# Altium footprint library IC.PCBLIB: 359 footprints (part 1 of 23)
Each footprint in its own frame and in the unit in brackets; x right, y up, seen from the top. Pads: shape width x height; smd on the part's side, far side on the other; paste and mask are expansions set on the pad; w line width, h text height; cw(c..) or ccw(c..) is an arc to the next point about the centre after c.
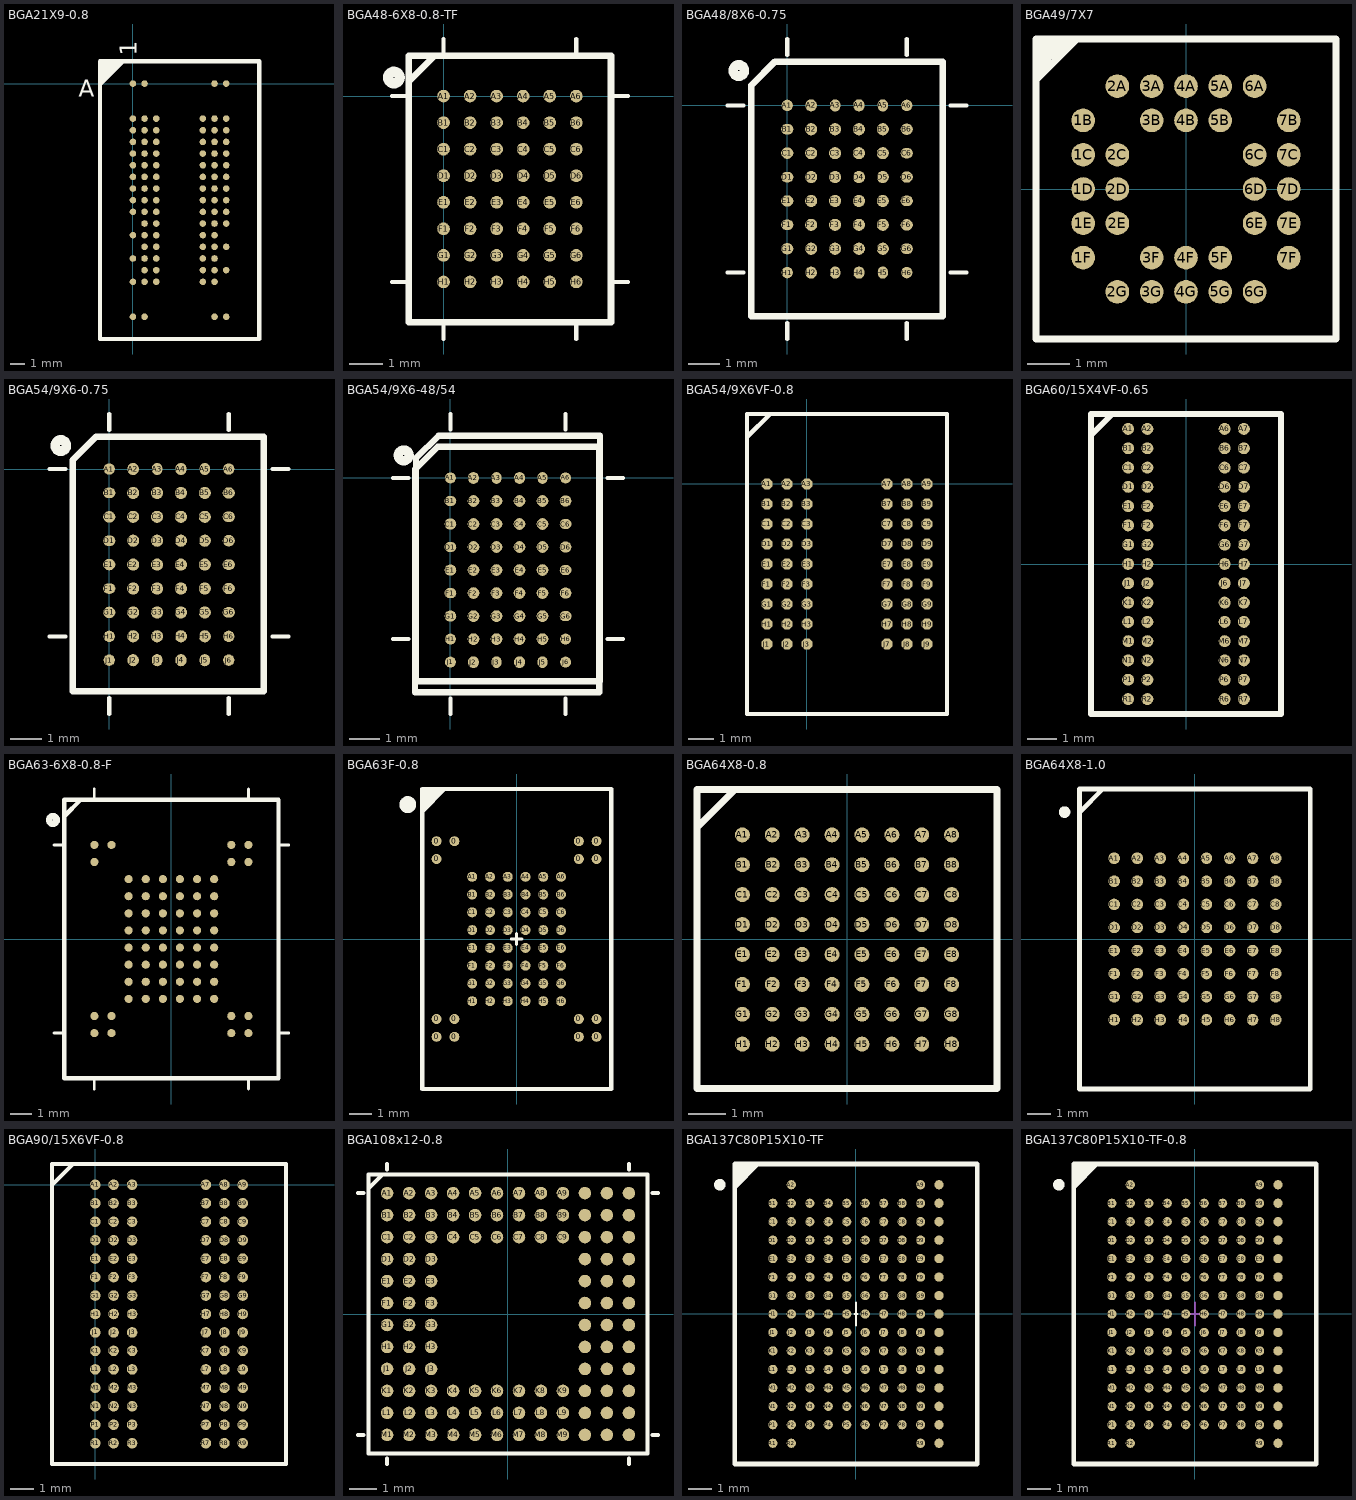
[diagram p0: the footprints below, top view; thin cyan lines are the x and y axes]

## BGA21X9-0.8 [mm]
height 1.27
pads (92):
  round 0.45 smd mask-25.4: A1(0,0) A2(0.8,0) A8(5.6,0) A9(6.4,0) AA1(0,-16.004) AA2(0.8,-16.004) AA8(5.6,-16.004) AA9(6.4,-16.004) D1(0,-2.401) D2(0.8,-2.401) D3(1.6,-2.401) D7(4.8,-2.401) D8(5.6,-2.401) D9(6.4,-2.401) E1(0,-3.201) E2(0.8,-3.201) E3(1.6,-3.201) E7(4.8,-3.201) E8(5.6,-3.201) E9(6.4,-3.201) F1(0,-4.001) F2(0.8,-4.001) F3(1.6,-4.001) F7(4.8,-4.001) F8(5.6,-4.001) F9(6.4,-4.001) G1(0,-4.801) G2(0.8,-4.801) G3(1.6,-4.801) G7(4.8,-4.801) G8(5.6,-4.801) G9(6.4,-4.801) H1(0,-5.601) H2(0.8,-5.601) H3(1.6,-5.601) H7(4.8,-5.601) H8(5.6,-5.601) H9(6.4,-5.601) J1(0,-6.402) J2(0.8,-6.402) J3(1.6,-6.402) J7(4.8,-6.402) J8(5.6,-6.402) J9(6.4,-6.402) K1(0,-7.202) K2(0.8,-7.202) K3(1.6,-7.202) K7(4.8,-7.202) K8(5.6,-7.202) K9(6.4,-7.202) L1(0,-8.002) L2(0.8,-8.002) L3(1.6,-8.002) L7(4.8,-8.002) L8(5.6,-8.002) L9(6.4,-8.002) M1(0,-8.802) M2(0.8,-8.802) M3(1.6,-8.802) M7(4.8,-8.802) M8(5.6,-8.802) M9(6.4,-8.802) N2(0.8,-9.603) N3(1.6,-9.603) N7(4.8,-9.603) N8(5.6,-9.603) N9(6.4,-9.603) P1(0,-10.403) P2(0.8,-10.403) P3(1.6,-10.403) P7(4.8,-10.403) P8(5.6,-10.403) R2(0.8,-11.203) R3(1.6,-11.203) R7(4.8,-11.203) R8(5.6,-11.203) R9(6.4,-11.203) T1(0,-12.003) T2(0.8,-12.003) T3(1.6,-12.003) T7(4.8,-12.003) T8(5.6,-12.003) U2(0.8,-12.804) U3(1.6,-12.804) U7(4.8,-12.804) U8(5.6,-12.804) U9(6.4,-12.804) V1(0,-13.604) V2(0.8,-13.604) V3(1.6,-13.604) V7(4.8,-13.604) V8(5.6,-13.604)
TopOverlay:
  region: -2.261,-0.256 -0.483,1.522 -2.261,1.522
  lines w0.305: -2.261,-17.528 -2.261,1.522 8.661,1.522 8.661,-17.528 -2.261,-17.528
  text "A" at -3.708,-0.891 h1.16
  text "1" at 0.279,1.903 h1.16

## BGA48-6X8-0.8-TF [mil]
height 45
pads (48):
  round 15 smd: A1(0,0) A2(31.5,0) A3(62.99,0) A4(94.49,0) A5(125.98,0) A6(157.48,0) B1(0,-31.5) B2(31.5,-31.5) B3(62.99,-31.5) B4(94.49,-31.5) B5(125.98,-31.5) B6(157.48,-31.5) C1(0,-62.99) C2(31.5,-62.99) C3(62.99,-62.99) C4(94.49,-62.99) C5(125.98,-62.99) C6(157.48,-62.99) D1(0,-94.49) D2(31.5,-94.49) D3(62.99,-94.49) D4(94.49,-94.49) D5(125.98,-94.49) D6(157.48,-94.49) E1(0,-125.98) E2(31.5,-125.98) E3(62.99,-125.98) E4(94.49,-125.98) E5(125.98,-125.98) E6(157.48,-125.98) F1(0,-157.48) F2(31.5,-157.48) F3(62.99,-157.48) F4(94.49,-157.48) F5(125.98,-157.48) F6(157.48,-157.48) G1(0,-188.98) G2(31.5,-188.98) G3(62.99,-188.98) G4(94.49,-188.98) G5(125.98,-188.98) G6(157.48,-188.98) H1(0,-220.47) H2(31.5,-220.47) H3(62.99,-220.47) H4(94.49,-220.47) H5(125.98,-220.47) H6(157.48,-220.47)
TopOverlay:
  circle w12: c-58.9,22 r6.9
  lines w5: -61.26,-220.47 -41.26,-220.47 ; -61.26,0 -41.26,0 ; 0,-288.24 0,-268.24 ; 0,47.76 0,67.76 ; 157.48,-288.24 157.48,-268.24 ; 157.48,47.76 157.48,67.76 ; 198.74,-220.47 218.74,-220.47 ; 198.74,0 218.74,0
  lines w8: -40.13,18.63 -11,47.76 ; -41.26,-268.24 198.74,-268.24 198.74,47.76 -41.26,47.76 -41.26,-268.24

## BGA48/8X6-0.75 [mil]
height 1574.8
pads (48):
  round 14 smd: A1(0,0) A6(147.64,0) H1(0,-206.69) H6(147.64,-206.69)
  oval 14x15 smd: A2(29.53,0) A4(88.58,0) H2(29.53,-206.69) H4(88.58,-206.69)
  oval 13x15 smd: A3(59.05,0) A5(118.11,0) H3(59.05,-206.69) H5(118.11,-206.69)
  oval 15x13 smd: B1(0,-29.53) C6(147.64,-59.05) D1(0,-88.58) E6(147.64,-118.11) F1(0,-147.64) G6(147.64,-177.17)
  round 15 smd: B2(29.53,-29.53) B3(59.06,-29.53) B4(88.58,-29.53) B5(118.11,-29.53) C2(29.53,-59.06) C3(59.06,-59.06) C4(88.58,-59.06) C5(118.11,-59.06) D2(29.53,-88.58) D3(59.06,-88.58) D4(88.58,-88.58) D5(118.11,-88.58) E2(29.53,-118.11) E3(59.06,-118.11) E4(88.58,-118.11) E5(118.11,-118.11) F2(29.53,-147.64) F3(59.06,-147.64) F4(88.58,-147.64) F5(118.11,-147.64) G2(29.53,-177.17) G3(59.06,-177.17) G4(88.58,-177.17) G5(118.11,-177.17)
  oval 15x14 smd: B6(147.64,-29.53) C1(0,-59.05) D6(147.64,-88.58) E1(0,-118.11) F6(147.64,-147.64) G1(0,-177.17)
TopOverlay:
  circle w12: c-59.9,43 r6.9
  lines w5: -74,-206.69 -54,-206.69 ; -74,0 -54,0 ; 0,-288.69 0,-268.69 ; 0,62 0,82 ; 147.64,-288.69 147.64,-268.69 ; 147.64,62 147.64,82 ; 201.64,-206.69 221.64,-206.69 ; 201.64,0 221.64,0
  lines w8: -44.29,-260.83 191.93,-260.83 191.93,54.17 -15.16,54.13 -44.29,25 -44.29,-260.83

## BGA49/7X7 [mm]
pads (32):
  round 0.55 smd: 1B(-2.4,1.6) 1C(-2.4,0.8) 1D(-2.4,0) 1E(-2.4,-0.8) 1F(-2.4,-1.6) 2A(-1.6,2.4) 2C(-1.6,0.8) 2D(-1.6,0) 2E(-1.6,-0.8) 2G(-1.6,-2.4) 3A(-0.8,2.4) 3B(-0.8,1.6) 3F(-0.8,-1.6) 3G(-0.8,-2.4) 4A(0,2.4) 4B(0,1.6) 4F(0,-1.6) 4G(0,-2.4) 5A(0.8,2.4) 5B(0.8,1.6) 5F(0.8,-1.6) 5G(0.8,-2.4) 6A(1.6,2.4) 6C(1.6,0.8) 6D(1.6,0) 6E(1.6,-0.8) 6G(1.6,-2.4) 7B(2.4,1.6) 7C(2.4,0.8) 7D(2.4,0) 7E(2.4,-0.8) 7F(2.4,-1.6)
TopOverlay:
  rectangle: -3.073,3.126 -2.914,3.213
  rectangle: -3.073,3.213 -2.827,3.316
  rectangle: -3.073,3.316 -2.724,3.5
  rectangle: -3.5,2.812 -3.228,2.921
  rectangle: -3.5,2.722 -3.318,2.896
  rectangle: -3.5,2.907 -3.133,3.019
  rectangle: -3.5,3.019 -3.021,3.5
  lines w0.152: -3.5,2.54 -2.54,3.5 ; -3.5,-3.5 3.5,-3.5 3.5,3.5 -3.5,3.5 -3.5,-3.5

## BGA54/9X6-0.75 [mil]
height 39.37
pads (54):
  round 14 smd: A1(0,0) A6(147.64,0) H1(0,-206.69) H6(147.64,-206.69) J1(0,-236.22) J6(147.64,-236.22)
  oval 14x15 smd: A2(29.53,0) A4(88.58,0) J2(29.53,-236.22) J4(88.58,-236.22)
  oval 13x15 smd: A3(59.05,0) A5(118.11,0) J3(59.06,-236.22) J5(118.11,-236.22)
  oval 15x13 smd: B1(0,-29.53) C6(147.64,-59.05) D1(0,-88.58) E6(147.64,-118.11) F1(0,-147.64) G6(147.64,-177.17)
  round 15 smd: B2(29.53,-29.53) B3(59.06,-29.53) B4(88.58,-29.53) B5(118.11,-29.53) C2(29.53,-59.06) C3(59.06,-59.06) C4(88.58,-59.06) C5(118.11,-59.06) D2(29.53,-88.58) D3(59.06,-88.58) D4(88.58,-88.58) D5(118.11,-88.58) E2(29.53,-118.11) E3(59.06,-118.11) E4(88.58,-118.11) E5(118.11,-118.11) F2(29.53,-147.64) F3(59.06,-147.64) F4(88.58,-147.64) F5(118.11,-147.64) G2(29.53,-177.17) G3(59.06,-177.17) G4(88.58,-177.17) G5(118.11,-177.17) H2(29.53,-206.69) H3(59.05,-206.69) H4(88.58,-206.69) H5(118.11,-206.69)
  oval 15x14 smd: B6(147.64,-29.53) C1(0,-59.05) D6(147.64,-88.58) E1(0,-118.11) F6(147.64,-147.64) G1(0,-177.17)
TopOverlay:
  circle w12: c-59.9,29 r6.9
  lines w5: -74,-206.69 -54,-206.69 ; -74,0 -54,0 ; 0,-302.69 0,-282.69 ; 0,48 0,68 ; 147.64,-302.69 147.64,-282.69 ; 147.64,48 147.64,68 ; 201.64,-206.69 221.64,-206.69 ; 201.64,0 221.64,0
  lines w8: -45.29,-274.83 -45.29,11 -16.16,40.13 190.93,40.17 190.93,-274.83 -45.29,-274.83

## BGA54/9X6-48/54 [mil]
pads (54):
  round 14 smd: A1(0,0) A6(147.64,0) H1(0,-206.69) H6(147.64,-206.69) J1(0,-236.22) J6(147.64,-236.22)
  oval 14x15 smd: A2(29.53,0) A4(88.58,0) J2(29.53,-236.22) J4(88.58,-236.22)
  oval 13x15 smd: A3(59.05,0) A5(118.11,0) J3(59.06,-236.22) J5(118.11,-236.22)
  oval 15x13 smd: B1(0,-29.53) C6(147.64,-59.05) D1(0,-88.58) E6(147.64,-118.11) F1(0,-147.64) G6(147.64,-177.17)
  round 15 smd: B2(29.53,-29.53) B3(59.06,-29.53) B4(88.58,-29.53) B5(118.11,-29.53) C2(29.53,-59.06) C3(59.06,-59.06) C4(88.58,-59.06) C5(118.11,-59.06) D2(29.53,-88.58) D3(59.06,-88.58) D4(88.58,-88.58) D5(118.11,-88.58) E2(29.53,-118.11) E3(59.06,-118.11) E4(88.58,-118.11) E5(118.11,-118.11) F2(29.53,-147.64) F3(59.06,-147.64) F4(88.58,-147.64) F5(118.11,-147.64) G2(29.53,-177.17) G3(59.06,-177.17) G4(88.58,-177.17) G5(118.11,-177.17) H2(29.53,-206.69) H3(59.05,-206.69) H4(88.58,-206.69) H5(118.11,-206.69)
  oval 15x14 smd: B6(147.64,-29.53) C1(0,-59.05) D6(147.64,-88.58) E1(0,-118.11) F6(147.64,-147.64) G1(0,-177.17)
TopOverlay:
  circle w12: c-59.9,29 r6.9
  lines w5: -74,-206.69 -54,-206.69 ; -74,0 -54,0 ; 0,-302.69 0,-282.69 ; 0,62 0,82 ; 147.64,-302.69 147.64,-282.69 ; 147.64,62 147.64,82 ; 201.64,-206.69 221.64,-206.69 ; 201.64,0 221.64,0
  lines w8: -45.29,-274.83 -45.29,11 -16.16,40.13 190.93,40.13 190.93,-274.83 -45.29,-274.83 ; -44.29,-260.83 191.93,-260.83 191.93,54.13 -15.16,54.13 -44.29,25 -44.29,-260.83

## BGA54/9X6VF-0.8 [mil]
height 39.37
pads (54):
  round 18 smd: A1(-62.99,0) A2(-31.5,0) A3(0,0) A7(125.98,0) A8(157.48,0) A9(188.98,0) B1(-62.99,-31.5) B2(-31.5,-31.5) B3(0,-31.5) B7(125.98,-31.5) B8(157.48,-31.5) B9(188.98,-31.5) C1(-62.99,-62.99) C2(-31.5,-62.99) C3(0,-62.99) C7(125.98,-62.99) C8(157.48,-62.99) C9(188.98,-62.99) D1(-62.99,-94.49) D2(-31.5,-94.49) D3(0,-94.49) D7(125.98,-94.49) D8(157.48,-94.49) D9(188.98,-94.49) E1(-62.99,-125.98) E2(-31.5,-125.98) E3(0,-125.98) E7(125.98,-125.98) E8(157.48,-125.98) E9(188.98,-125.98) F1(-62.99,-157.48) F2(-31.5,-157.48) F3(0,-157.48) F7(125.98,-157.48) F8(157.48,-157.48) F9(188.98,-157.48) G1(-62.99,-188.98) G2(-31.5,-188.98) G3(0,-188.98) G7(125.98,-188.98) G8(157.48,-188.98) G9(188.98,-188.98) H1(-62.99,-220.47) H2(-31.5,-220.47) H3(0,-220.47) H7(125.98,-220.47) H8(157.48,-220.47) H9(188.98,-220.47) J1(-62.99,-251.97) J2(-31.5,-251.97) J3(0,-251.97) J7(125.98,-251.97) J8(157.48,-251.97) J9(188.98,-251.97)
TopOverlay:
  lines w7: -94,74.24 -58,110.24 ; -94.49,-362.2 -94.49,110.24 220.47,110.24 220.47,-362.2 -94.49,-362.2

## BGA60/15X4VF-0.65 [mm]
pads (60):
  round 0.4 smd: A1(-1.95,4.55) A2(-1.3,4.55) A6(1.3,4.55) A7(1.95,4.55) B1(-1.95,3.9) B2(-1.3,3.9) B6(1.3,3.9) B7(1.95,3.9) C1(-1.95,3.25) C2(-1.3,3.25) C6(1.3,3.25) C7(1.95,3.25) D1(-1.95,2.6) D2(-1.3,2.6) D6(1.3,2.6) D7(1.95,2.6) E1(-1.95,1.95) E2(-1.3,1.95) E6(1.3,1.95) E7(1.95,1.95) F1(-1.95,1.3) F2(-1.3,1.3) F6(1.3,1.3) F7(1.95,1.3) G1(-1.95,0.65) G2(-1.3,0.65) G6(1.3,0.65) G7(1.95,0.65) H1(-1.95,0) H2(-1.3,0) H6(1.3,0) H7(1.95,0) J1(-1.95,-0.65) J2(-1.3,-0.65) J6(1.3,-0.65) J7(1.95,-0.65) K1(-1.95,-1.3) K2(-1.3,-1.3) K6(1.3,-1.3) K7(1.95,-1.3) L1(-1.95,-1.95) L2(-1.3,-1.95) L6(1.3,-1.95) L7(1.95,-1.95) M1(-1.95,-2.6) M2(-1.3,-2.6) M6(1.3,-2.6) M7(1.95,-2.6) N1(-1.95,-3.25) N2(-1.3,-3.25) N6(1.3,-3.25) N7(1.95,-3.25) P1(-1.95,-3.9) P2(-1.3,-3.9) P6(1.3,-3.9) P7(1.95,-3.9) R1(-1.95,-4.55) R2(-1.3,-4.55) R6(1.3,-4.55) R7(1.95,-4.55)
TopOverlay:
  lines w0.2: -3.2,-5.055 3.2,-5.055 3.2,5.055 -3.2,5.055 -3.2,-5.055
  lines w0.203: -3.2,4.343 -2.489,5.055

## BGA63-6X8-0.8-F [mm]
height 1.016
pads (63):
  round 0.381 smd: A1(-2,2.8) A2(-1.2,2.8) A3(-0.4,2.8) A4(0.4,2.8) A5(1.2,2.8) A6(2,2.8) B1(-2,2) B2(-1.2,2) B3(-0.4,2) B4(0.4,2) B5(1.2,2) B6(2,2) C1(-2,1.2) C2(-1.2,1.2) C3(-0.4,1.2) C4(0.4,1.2) C5(1.2,1.2) C6(2,1.2) D1(-2,0.4) D2(-1.2,0.4) D3(-0.4,0.4) D4(0.4,0.4) D5(1.2,0.4) D6(2,0.4) E1(-2,-0.4) E2(-1.2,-0.4) E3(-0.4,-0.4) E4(0.4,-0.4) E5(1.2,-0.4) E6(2,-0.4) F1(-2,-1.2) F2(-1.2,-1.2) F3(-0.4,-1.2) F4(0.4,-1.2) F5(1.2,-1.2) F6(2,-1.2) G1(-2,-2) G2(-1.2,-2) G3(-0.4,-2) G4(0.4,-2) G5(1.2,-2) G6(2,-2) H1(-2,-2.8) H2(-1.2,-2.8) H3(-0.4,-2.8) H4(0.4,-2.8) H5(1.2,-2.8) H6(2,-2.8) NC(-3.6,-4.4) NC(-3.6,-3.6) NC(-3.6,3.6) NC(-3.6,4.4) NC(-2.8,-4.4) NC(-2.8,-3.6) NC(-2.8,4.4) NC(2.8,-4.4) NC(2.8,-3.6) NC(2.8,3.6) NC(2.8,4.4) NC(3.6,-4.4) NC(3.6,-3.6) NC(3.6,3.6) NC(3.6,4.4)
TopOverlay:
  circle w0.305: c-5.535,5.563 r0.175
  lines w0.127: -5.486,-4.394 -4.978,-4.394 ; -5.486,4.394 -4.978,4.394 ; -3.607,-7.01 -3.607,-6.502 ; -3.607,6.502 -3.607,7.01 ; 3.607,-7.01 3.607,-6.502 ; 3.607,6.502 3.607,7.01 ; 4.978,-4.394 5.486,-4.394 ; 4.978,4.394 5.486,4.394
  lines w0.203: -4.982,5.762 -4.242,6.502 ; -5.004,-6.502 5.004,-6.502 5.004,6.502 -5.004,6.502 -5.004,-6.502

## BGA63F-0.8 [mm]
height 1.27
pads (63):
  round 0.45 smd: 0(-3.6,-3.6) 0(-3.6,3.6) 0(-3.6,-4.4) 0(-3.6,4.4) 0(-2.8,-3.6) 0(-2.8,-4.4) 0(-2.8,4.4) 0(2.8,3.6) 0(2.8,-4.4) 0(2.8,4.4) 0(2.8,-3.6) 0(3.6,-4.4) 0(3.6,4.4) 0(3.6,-3.6) 0(3.6,3.6) A1(-2,2.8) A2(-1.2,2.8) A3(-0.4,2.8) A4(0.4,2.8) A5(1.2,2.8) A6(2,2.8) B1(-2,2) B2(-1.2,2) B3(-0.4,2) B4(0.4,2) B5(1.2,2) B6(2,2) C1(-2,1.2) C2(-1.2,1.2) C3(-0.4,1.2) C4(0.4,1.2) C5(1.2,1.2) C6(2,1.2) D1(-2,0.4) D2(-1.2,0.4) D3(-0.4,0.4) D4(0.4,0.4) D5(1.2,0.4) D6(2,0.4) E1(-2,-0.4) E2(-1.2,-0.4) E3(-0.4,-0.4) E4(0.4,-0.4) E5(1.2,-0.4) E6(2,-0.4) F1(-2,-1.2) F2(-1.2,-1.2) F3(-0.4,-1.2) F4(0.4,-1.2) F5(1.2,-1.2) F6(2,-1.2) G1(-2,-2) G2(-1.2,-2) G3(-0.4,-2) G4(0.4,-2) G5(1.2,-2) G6(2,-2) H1(-2,-2.8) H2(-1.2,-2.8) H3(-0.4,-2.8) H4(0.4,-2.8) H5(1.2,-2.8) H6(2,-2.8)
TopOverlay:
  circle w0.508: c-4.9,6.046 r0.125
  region: -3.25,6.746 -4.25,5.746 -4.25,6.746
  lines w0.127: -0.241,0 0,0 ; 0,-0.241 0,0 ; 0,0.241 0,0 ; 0.241,0 0,0
  lines w0.2: -4.25,5.746 -3.25,6.746 ; -4.25,-6.75 4.25,-6.75 4.25,0 4.25,6.75 -4.25,6.75 -4.25,0 -4.25,-6.75

## BGA64X8-0.8 [mm]
pads (64):
  round 0.4 smd: A1(-2.8,2.8) A2(-2,2.8) A3(-1.2,2.8) A4(-0.4,2.8) A5(0.4,2.8) A6(1.2,2.8) A7(2,2.8) A8(2.8,2.8) B1(-2.8,2) B2(-2,2) B3(-1.2,2) B4(-0.4,2) B5(0.4,2) B6(1.2,2) B7(2,2) B8(2.8,2) C1(-2.8,1.2) C2(-2,1.2) C3(-1.2,1.2) C4(-0.4,1.2) C5(0.4,1.2) C6(1.2,1.2) C7(2,1.2) C8(2.8,1.2) D1(-2.8,0.4) D2(-2,0.4) D3(-1.2,0.4) D4(-0.4,0.4) D5(0.4,0.4) D6(1.2,0.4) D7(2,0.4) D8(2.8,0.4) E1(-2.8,-0.4) E2(-2,-0.4) E3(-1.2,-0.4) E4(-0.4,-0.4) E5(0.4,-0.4) E6(1.2,-0.4) E7(2,-0.4) E8(2.8,-0.4) F1(-2.8,-1.2) F2(-2,-1.2) F3(-1.2,-1.2) F4(-0.4,-1.2) F5(0.4,-1.2) F6(1.2,-1.2) F7(2,-1.2) F8(2.8,-1.2) G1(-2.8,-2) G2(-2,-2) G3(-1.2,-2) G4(-0.4,-2) G5(0.4,-2) G6(1.2,-2) G7(2,-2) G8(2.8,-2) H1(-2.8,-2.8) H2(-2,-2.8) H3(-1.2,-2.8) H4(-0.4,-2.8) H5(0.4,-2.8) H6(1.2,-2.8) H7(2,-2.8) H8(2.8,-2.8)
TopOverlay:
  lines w0.2: -4.013,2.997 -2.997,4.013 ; 3.987,-3.987 -4.013,-3.987 -4.013,4.013 4.013,4.013 4.013,-3.987

## BGA64X8-1.0 [mm]
height 1.397
pads (64):
  round 0.5 smd: A1(-3.5,3.5) A2(-2.5,3.5) A3(-1.5,3.5) A4(-0.5,3.5) A5(0.5,3.5) A6(1.5,3.5) A7(2.5,3.5) A8(3.5,3.5) B1(-3.5,2.5) B2(-2.5,2.5) B3(-1.5,2.5) B4(-0.5,2.5) B5(0.5,2.5) B6(1.5,2.5) B7(2.5,2.5) B8(3.5,2.5) C1(-3.5,1.5) C2(-2.5,1.5) C3(-1.5,1.5) C4(-0.5,1.5) C5(0.5,1.5) C6(1.5,1.5) C7(2.5,1.5) C8(3.5,1.5) D1(-3.5,0.5) D2(-2.5,0.5) D3(-1.5,0.5) D4(-0.5,0.5) D5(0.5,0.5) D6(1.5,0.5) D7(2.5,0.5) D8(3.5,0.5) E1(-3.5,-0.5) E2(-2.5,-0.5) E3(-1.5,-0.5) E4(-0.5,-0.5) E5(0.5,-0.5) E6(1.5,-0.5) E7(2.5,-0.5) E8(3.5,-0.5) F1(-3.5,-1.5) F2(-2.5,-1.5) F3(-1.5,-1.5) F4(-0.5,-1.5) F5(0.5,-1.5) F6(1.5,-1.5) F7(2.5,-1.5) F8(3.5,-1.5) G1(-3.5,-2.5) G2(-2.5,-2.5) G3(-1.5,-2.5) G4(-0.5,-2.5) G5(0.5,-2.5) G6(1.5,-2.5) G7(2.5,-2.5) G8(3.5,-2.5) H1(-3.5,-3.5) H2(-2.5,-3.5) H3(-1.5,-3.5) H4(-0.5,-3.5) H5(0.5,-3.5) H6(1.5,-3.5) H7(2.5,-3.5) H8(3.5,-3.5)
TopOverlay:
  circle w0.25: c-5.65,5.5 r0.125
  lines w0.2: -5,5.5 -4,6.5 ; -5,-6.5 5,-6.5 5,6.5 -5,6.5 -5,-6.5

## BGA90/15X6VF-0.8 [mil]
pads (90):
  round 18 smd: A1(0,0) A2(31.5,0) A3(62.99,0) A7(188.98,0) A8(220.47,0) A9(251.97,0) B1(0,-31.5) B2(31.5,-31.5) B3(62.99,-31.5) B7(188.98,-31.5) B8(220.47,-31.5) B9(251.97,-31.5) C1(0,-62.99) C2(31.5,-62.99) C3(62.99,-62.99) C7(188.98,-62.99) C8(220.47,-62.99) C9(251.97,-62.99) D1(0,-94.49) D2(31.5,-94.49) D3(62.99,-94.49) D7(188.98,-94.49) D8(220.47,-94.49) D9(251.97,-94.49) E1(0,-125.98) E2(31.5,-125.98) E3(62.99,-125.98) E7(188.98,-125.98) E8(220.47,-125.98) E9(251.97,-125.98) F1(0,-157.48) F2(31.5,-157.48) F3(62.99,-157.48) F7(188.98,-157.48) F8(220.47,-157.48) F9(251.97,-157.48) G1(0,-188.98) G2(31.5,-188.98) G3(62.99,-188.98) G7(188.98,-188.98) G8(220.47,-188.98) G9(251.97,-188.98) H1(0,-220.47) H2(31.5,-220.47) H3(62.99,-220.47) H7(188.98,-220.47) H8(220.47,-220.47) H9(251.97,-220.47) J1(0,-251.97) J2(31.5,-251.97) J3(62.99,-251.97) J7(188.98,-251.97) J8(220.47,-251.97) J9(251.97,-251.97) K1(0,-283.46) K2(31.5,-283.46) K3(62.99,-283.46) K7(188.98,-283.46) K8(220.47,-283.46) K9(251.97,-283.46) L1(0,-314.96) L2(31.5,-314.96) L3(62.99,-314.96) L7(188.98,-314.96) L8(220.47,-314.96) L9(251.97,-314.96) M1(0,-346.46) M2(31.5,-346.46) M3(62.99,-346.46) M7(188.98,-346.46) M8(220.47,-346.46) M9(251.97,-346.46) N1(0,-377.95) N2(31.5,-377.95) N3(62.99,-377.95) N7(188.98,-377.95) N8(220.47,-377.95) N9(251.97,-377.95) P1(0,-409.45) P2(31.5,-409.45) P3(62.99,-409.45) P7(188.98,-409.45) P8(220.47,-409.45) P9(251.97,-409.45) R1(0,-440.95) R2(31.5,-440.95) R3(62.99,-440.95) R7(188.98,-440.95) R8(220.47,-440.95) R9(251.97,-440.95)
TopOverlay:
  lines w7: -74.02,-0.47 -38.02,35.53 ; -74.02,-476.47 325.98,-476.47 325.98,35.53 -74.02,35.53 -74.02,-476.47

## BGA108x12-0.8 [mm]
height 1.016
pads (108):
  round 0.457 smd: A1(-4.4,4.4) A2(-3.6,4.4) A3(-2.8,4.4) A4(-2,4.4) A5(-1.2,4.4) A6(-0.4,4.4) A7(0.4,4.4) A8(1.2,4.4) A9(2,4.4) A10(2.8,4.4) A11(3.6,4.4) A12(4.4,4.4) B1(-4.4,3.6) B2(-3.6,3.6) B3(-2.8,3.6) B4(-2,3.6) B5(-1.2,3.6) B6(-0.4,3.6) B7(0.4,3.6) B8(1.2,3.6) B9(2,3.6) B10(2.8,3.6) B11(3.6,3.6) B12(4.4,3.6) C1(-4.4,2.8) C2(-3.6,2.8) C3(-2.8,2.8) C4(-2,2.8) C5(-1.2,2.8) C6(-0.4,2.8) C7(0.4,2.8) C8(1.2,2.8) C9(2,2.8) C10(2.8,2.8) C11(3.6,2.8) C12(4.4,2.8) D1(-4.4,2) D2(-3.6,2) D3(-2.8,2) D10(2.8,2) D11(3.6,2) D12(4.4,2) E1(-4.4,1.2) E2(-3.6,1.2) E3(-2.8,1.2) E10(2.8,1.2) E11(3.6,1.2) E12(4.4,1.2) F1(-4.4,0.4) F2(-3.6,0.4) F3(-2.8,0.4) F10(2.8,0.4) F11(3.6,0.4) F12(4.4,0.4) G1(-4.4,-0.4) G2(-3.6,-0.4) G3(-2.8,-0.4) G10(2.8,-0.4) G11(3.6,-0.4) G12(4.4,-0.4) H1(-4.4,-1.2) H2(-3.6,-1.2) H3(-2.8,-1.2) H10(2.8,-1.2) H11(3.6,-1.2) H12(4.4,-1.2) J1(-4.4,-2) J2(-3.6,-2) J3(-2.8,-2) J10(2.8,-2) J11(3.6,-2) J12(4.4,-2) K1(-4.4,-2.8) K2(-3.6,-2.8) K3(-2.8,-2.8) K4(-2,-2.8) K5(-1.2,-2.8) K6(-0.4,-2.8) K7(0.4,-2.8) K8(1.2,-2.8) K9(2,-2.8) K10(2.8,-2.8) K11(3.6,-2.8) K12(4.4,-2.8) L1(-4.4,-3.6) L2(-3.6,-3.6) L3(-2.8,-3.6) L4(-2,-3.6) L5(-1.2,-3.6) L6(-0.4,-3.6) L7(0.4,-3.6) L8(1.2,-3.6) L9(2,-3.6) L10(2.8,-3.6) L11(3.6,-3.6) L12(4.4,-3.6) M1(-4.4,-4.4) M2(-3.6,-4.4) M3(-2.8,-4.4) M4(-2,-4.4) M5(-1.2,-4.4) M6(-0.4,-4.4) M7(0.4,-4.4) M8(1.2,-4.4) M9(2,-4.4) M10(2.8,-4.4) M11(3.6,-4.4) M12(4.4,-4.4)
TopOverlay:
  lines w0.152: -5.461,-4.4 -5.258,-4.4 ; -5.461,4.4 -5.258,4.4 ; -5.08,4.572 -4.572,5.08 ; -4.4,-5.461 -4.4,-5.258 ; -4.4,5.258 -4.4,5.461 ; 4.4,-5.461 4.4,-5.258 ; 4.4,5.258 4.4,5.461 ; 5.258,-4.4 5.461,-4.4 ; 5.258,4.4 5.461,4.4 ; -5.08,-5.08 -5.08,5.08 5.08,5.08 5.08,-5.08 -5.08,-5.08

## BGA137C80P15X10-TF [mm] "BGA, 137-Leads, Body 13.0x10.5mm,  Pitch 0.80mm"
height 1.2
pads (137):
  round 0.4 smd: A2(-2.8,5.6) A9(2.8,5.6) A10(3.6,5.6) B1(-3.6,4.8) B2(-2.8,4.8) B3(-2,4.8) B4(-1.2,4.8) B5(-0.4,4.8) B6(0.4,4.8) B7(1.2,4.8) B8(2,4.8) B9(2.8,4.8) B10(3.6,4.8) C1(-3.6,4) C2(-2.8,4) C3(-2,4) C4(-1.2,4) C5(-0.4,4) C6(0.4,4) C7(1.2,4) C8(2,4) C9(2.8,4) C10(3.6,4) D1(-3.6,3.2) D2(-2.8,3.2) D3(-2,3.2) D4(-1.2,3.2) D5(-0.4,3.2) D6(0.4,3.2) D7(1.2,3.2) D8(2,3.2) D9(2.8,3.2) D10(3.6,3.2) E1(-3.6,2.4) E2(-2.8,2.4) E3(-2,2.4) E4(-1.2,2.4) E5(-0.4,2.4) E6(0.4,2.4) E7(1.2,2.4) E8(2,2.4) E9(2.8,2.4) E10(3.6,2.4) F1(-3.6,1.6) F2(-2.8,1.6) F3(-2,1.6) F4(-1.2,1.6) F5(-0.4,1.6) F6(0.4,1.6) F7(1.2,1.6) F8(2,1.6) F9(2.8,1.6) F10(3.6,1.6) G1(-3.6,0.8) G2(-2.8,0.8) G3(-2,0.8) G4(-1.2,0.8) G5(-0.4,0.8) G6(0.4,0.8) G7(1.2,0.8) G8(2,0.8) G9(2.8,0.8) G10(3.6,0.8) H1(-3.6,0) H2(-2.8,0) H3(-2,0) H4(-1.2,0) H5(-0.4,0) H6(0.4,0) H7(1.2,0) H8(2,0) H9(2.8,0) H10(3.6,0) J1(-3.6,-0.8) J2(-2.8,-0.8) J3(-2,-0.8) J4(-1.2,-0.8) J5(-0.4,-0.8) J6(0.4,-0.8) J7(1.2,-0.8) J8(2,-0.8) J9(2.8,-0.8) J10(3.6,-0.8) K1(-3.6,-1.6) K2(-2.8,-1.6) K3(-2,-1.6) K4(-1.2,-1.6) K5(-0.4,-1.6) K6(0.4,-1.6) K7(1.2,-1.6) K8(2,-1.6) K9(2.8,-1.6) K10(3.6,-1.6) L1(-3.6,-2.4) L2(-2.8,-2.4) L3(-2,-2.4) L4(-1.2,-2.4) L5(-0.4,-2.4) L6(0.4,-2.4) L7(1.2,-2.4) L8(2,-2.4) L9(2.8,-2.4) L10(3.6,-2.4) M1(-3.6,-3.2) M2(-2.8,-3.2) M3(-2,-3.2) M4(-1.2,-3.2) M5(-0.4,-3.2) M6(0.4,-3.2) M7(1.2,-3.2) M8(2,-3.2) M9(2.8,-3.2) M10(3.6,-3.2) N1(-3.6,-4) N2(-2.8,-4) N3(-2,-4) N4(-1.2,-4) N5(-0.4,-4) N6(0.4,-4) N7(1.2,-4) N8(2,-4) N9(2.8,-4) N10(3.6,-4) P1(-3.6,-4.8) P2(-2.8,-4.8) P3(-2,-4.8) P4(-1.2,-4.8) P5(-0.4,-4.8) P6(0.4,-4.8) P7(1.2,-4.8) P8(2,-4.8) P9(2.8,-4.8) P10(3.6,-4.8) R1(-3.6,-5.6) R2(-2.8,-5.6) R9(2.8,-5.6) R10(3.6,-5.6)
TopOverlay:
  circle w0.25: c-5.9,5.6 r0.125
  region: -4.25,6.5 -5.25,5.5 -5.25,6.5
  lines w0.1: -0.058,0 0.056,0 ; 0,-0.5 0,0.5
  lines w0.2: -5.25,5.5 -4.25,6.5 ; -5.25,-6.5 5.25,-6.5 5.25,6.5 -5.25,6.5 -5.25,-6.5

## BGA137C80P15X10-TF-0.8 [mm] "BGA, 137-Leads, Body 13.0x10.5mm,  Pitch 0.80mm"
height 1.2
pads (137):
  round 0.4 smd: A2(-2.8,5.6) A9(2.8,5.6) A10(3.6,5.6) B1(-3.6,4.8) B2(-2.8,4.8) B3(-2,4.8) B4(-1.2,4.8) B5(-0.4,4.8) B6(0.4,4.8) B7(1.2,4.8) B8(2,4.8) B9(2.8,4.8) B10(3.6,4.8) C1(-3.6,4) C2(-2.8,4) C3(-2,4) C4(-1.2,4) C5(-0.4,4) C6(0.4,4) C7(1.2,4) C8(2,4) C9(2.8,4) C10(3.6,4) D1(-3.6,3.2) D2(-2.8,3.2) D3(-2,3.2) D4(-1.2,3.2) D5(-0.4,3.2) D6(0.4,3.2) D7(1.2,3.2) D8(2,3.2) D9(2.8,3.2) D10(3.6,3.2) E1(-3.6,2.4) E2(-2.8,2.4) E3(-2,2.4) E4(-1.2,2.4) E5(-0.4,2.4) E6(0.4,2.4) E7(1.2,2.4) E8(2,2.4) E9(2.8,2.4) E10(3.6,2.4) F1(-3.6,1.6) F2(-2.8,1.6) F3(-2,1.6) F4(-1.2,1.6) F5(-0.4,1.6) F6(0.4,1.6) F7(1.2,1.6) F8(2,1.6) F9(2.8,1.6) F10(3.6,1.6) G1(-3.6,0.8) G2(-2.8,0.8) G3(-2,0.8) G4(-1.2,0.8) G5(-0.4,0.8) G6(0.4,0.8) G7(1.2,0.8) G8(2,0.8) G9(2.8,0.8) G10(3.6,0.8) H1(-3.6,0) H2(-2.8,0) H3(-2,0) H4(-1.2,0) H5(-0.4,0) H6(0.4,0) H7(1.2,0) H8(2,0) H9(2.8,0) H10(3.6,0) J1(-3.6,-0.8) J2(-2.8,-0.8) J3(-2,-0.8) J4(-1.2,-0.8) J5(-0.4,-0.8) J6(0.4,-0.8) J7(1.2,-0.8) J8(2,-0.8) J9(2.8,-0.8) J10(3.6,-0.8) K1(-3.6,-1.6) K2(-2.8,-1.6) K3(-2,-1.6) K4(-1.2,-1.6) K5(-0.4,-1.6) K6(0.4,-1.6) K7(1.2,-1.6) K8(2,-1.6) K9(2.8,-1.6) K10(3.6,-1.6) L1(-3.6,-2.4) L2(-2.8,-2.4) L3(-2,-2.4) L4(-1.2,-2.4) L5(-0.4,-2.4) L6(0.4,-2.4) L7(1.2,-2.4) L8(2,-2.4) L9(2.8,-2.4) L10(3.6,-2.4) M1(-3.6,-3.2) M2(-2.8,-3.2) M3(-2,-3.2) M4(-1.2,-3.2) M5(-0.4,-3.2) M6(0.4,-3.2) M7(1.2,-3.2) M8(2,-3.2) M9(2.8,-3.2) M10(3.6,-3.2) N1(-3.6,-4) N2(-2.8,-4) N3(-2,-4) N4(-1.2,-4) N5(-0.4,-4) N6(0.4,-4) N7(1.2,-4) N8(2,-4) N9(2.8,-4) N10(3.6,-4) P1(-3.6,-4.8) P2(-2.8,-4.8) P3(-2,-4.8) P4(-1.2,-4.8) P5(-0.4,-4.8) P6(0.4,-4.8) P7(1.2,-4.8) P8(2,-4.8) P9(2.8,-4.8) P10(3.6,-4.8) R1(-3.6,-5.6) R2(-2.8,-5.6) R9(2.8,-5.6) R10(3.6,-5.6)
TopOverlay:
  circle w0.25: c-5.9,5.6 r0.125
  region: -4.25,6.5 -5.25,5.5 -5.25,6.5
  lines w0.2: -5.25,5.5 -4.25,6.5 ; -5.25,-6.5 -5.25,6.5 5.25,6.5 5.25,-6.5 -5.25,-6.5
Mechanical13:
  lines w0.1: -5.25,-6.5 -5.25,6.5 5.25,6.5 5.25,-6.5 -5.25,-6.5
Mechanical15:
  lines w0.1: -0.5,0 0.5,0 ; 0,-0.5 0,0.5